# Altium footprint library ACTION_Connector.PcbLib: 123 footprints (part 1 of 8)
Each footprint in its own frame and in the unit in brackets; x right, y up, seen from the top. Pads: shape width x height; smd on the part's side, far side on the other; paste and mask are expansions set on the pad; w line width, h text height; cw(c..) or ccw(c..) is an arc to the next point about the centre after c.
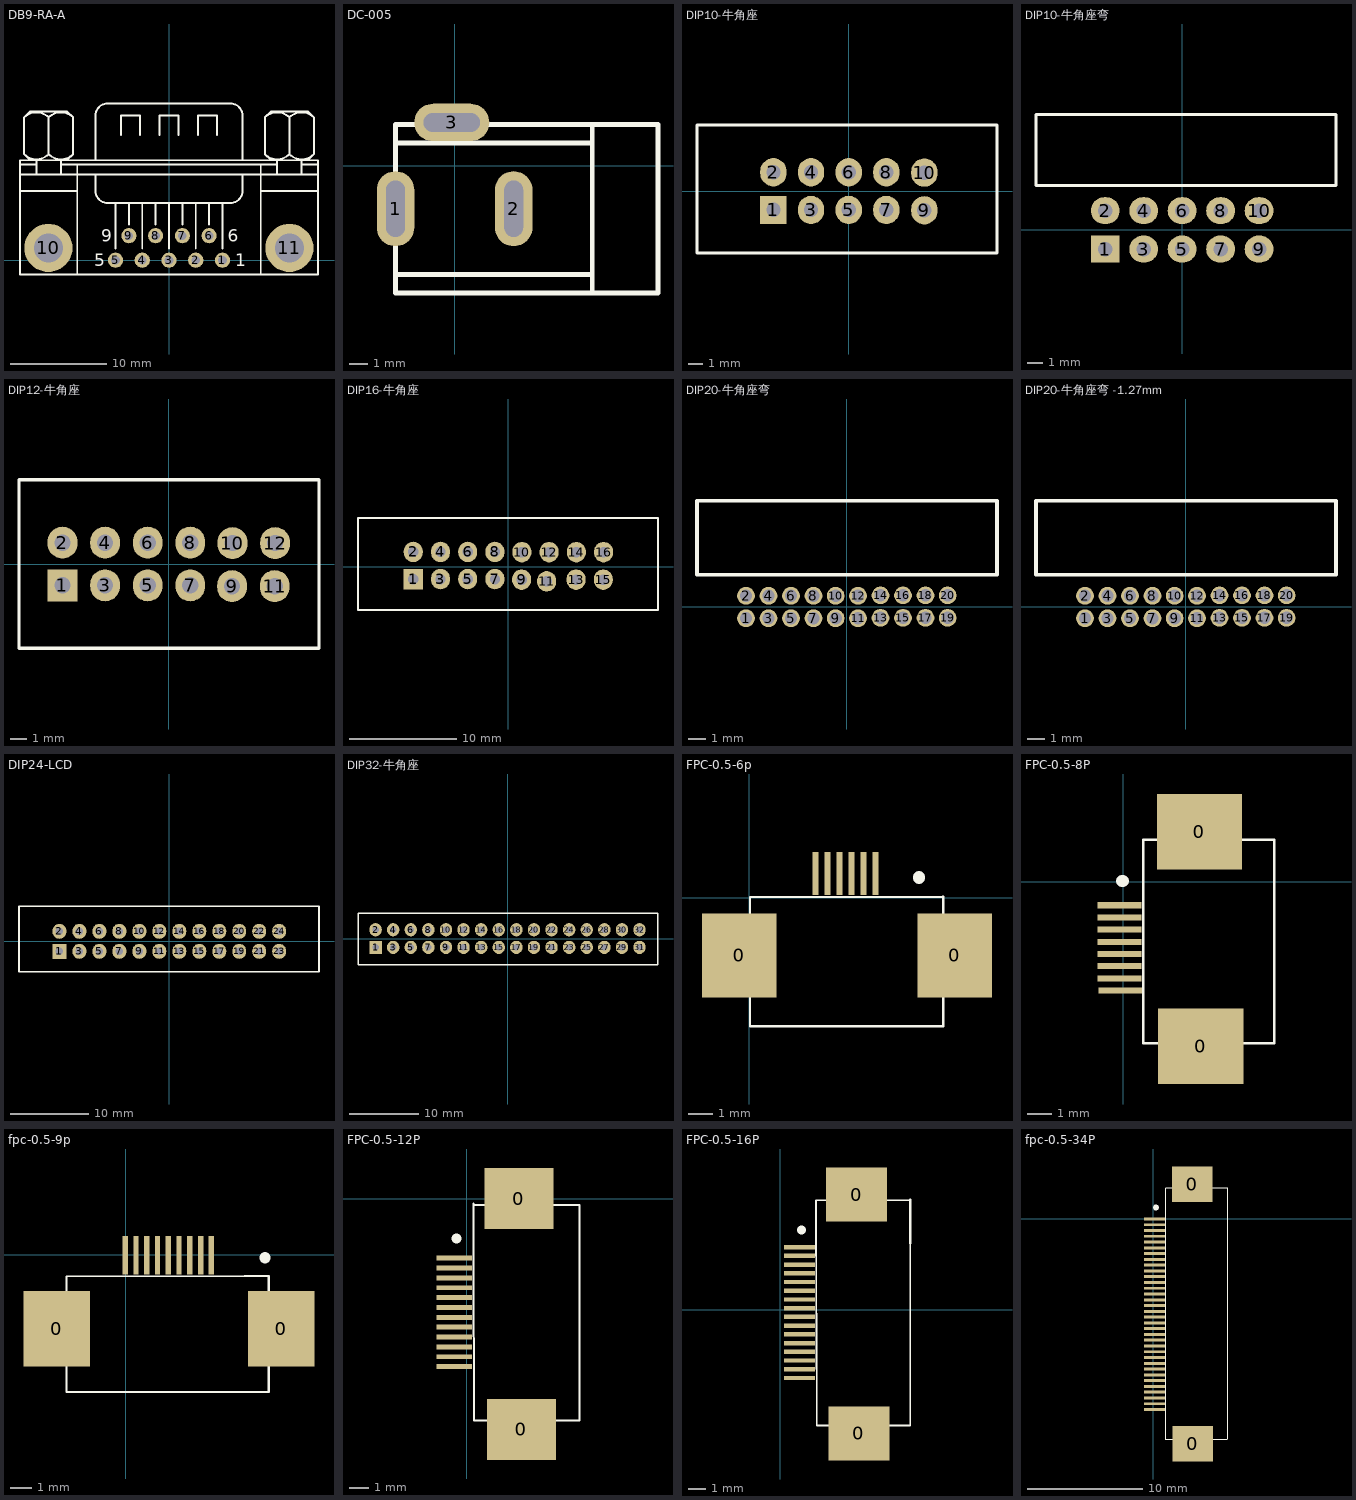
[diagram p0: the footprints below, top view; thin cyan lines are the x and y axes]

## DB9-RA-A [mil]
pads (11):
  round 62 hole 35: 1(218.33,0) 2(109.17,0) 3(0,0) 4(-109.17,0) 5(-218.33,0) 6(163.75,100) 7(54.58,100) 8(-54.58,100) 9(-163.75,100)
  round 196.67 hole 118.33: 10(-492.5,50) 11(491.67,50)
Top Overlay:
  lines w7.87: -608.79,283.07 -374.54,283.07 ; -608.79,349.74 608.79,349.74 ; -608.79,391.4 -541.67,391.4 ; -591.75,432.99 ccw(c-541.67,483.07) -491.58,432.99 ; -591.75,583.16 cw(c-541.67,533.07) -491.58,583.16 ; -566.67,408.07 -591.67,433.07 -591.67,583.07 -566.67,608.07 -416.67,608.07 -391.67,583.07 -391.67,433.07 -416.67,408.07 ; -541.67,349.74 -541.67,408.07 ; -491.75,432.99 ccw(c-441.67,483.07) -391.58,432.99 ; -491.75,583.16 cw(c-441.67,533.07) -391.58,583.16 ; -491.67,433.07 -491.67,583.07 ; -441.67,349.74 -441.67,408.07 ; -441.67,391.4 440.83,391.4 ; -374.54,-59.06 -374.54,391.4 ; -300,349.74 -300,283.07 ccw(c-250,283.07) -250,233.07 ; -300,408.07 -300,590.55 cw(c-250,590.55) -250,640.55 250,640.55 cw(c250,590.55) 300,590.55 300,408.07 ; -218.33,47.24 -218.33,233.07 ; -196.85,511.81 -196.85,590.55 -118.11,590.55 -118.11,511.81 ; -163.75,145.67 -163.75,233.07 ; -109.17,47.24 -109.17,233.07 ; -54.58,145.67 -54.58,233.07 ; -39.37,511.81 -39.37,590.55 0,590.55 39.37,590.55 39.37,511.81 ; 0,47.24 0,233.07 -250,233.07 ; 54.58,145.67 54.58,233.07 ; 109.17,47.24 109.17,233.07 ; 118.11,511.81 118.11,590.55 196.85,590.55 196.85,511.81 ; 163.75,145.67 163.75,233.07 ; 218.33,47.24 218.33,233.07 ; 300,349.74 300,283.07 cw(c250,283.07) 250,233.07 -250,233.07 ; 374.54,-59.06 374.54,391.4 ; 374.54,283.07 608.79,283.07 ; 391.58,432.99 ccw(c441.67,483.07) 491.75,432.99 ; 391.58,583.16 cw(c441.67,533.07) 491.75,583.16 ; 416.67,408.07 391.67,433.07 391.67,583.07 416.67,608.07 566.67,608.07 591.67,583.07 591.67,433.07 566.67,408.07 ; 440.83,349.74 440.83,408.07 ; 491.58,432.99 ccw(c541.66,483.07) 591.75,432.99 ; 491.58,583.16 cw(c541.66,533.07) 591.75,583.16 ; 491.67,433.07 491.67,583.07 ; 540.83,349.74 540.83,408.07 ; 540.83,391.4 608.79,391.4 ; -608.79,-59.06 -608.79,408.07 608.79,408.07 608.79,-59.06 366.67,-59.06 -366.67,-59.06 -608.79,-59.06
  text "9" at -275.75,74.8 h50
  text "5" at -304.46,-25.59 h50
  text "1" at 271.18,-25.59 h50
  text "6" at 239.68,74.8 h50
3D body "User Library-DRB-9M.STEP": height 501.97, standoff -143.7, extent -599.29,-58.8 601.5,638.05

## DC-005 [mm]
pads (3):
  oval 2x4 hole 1 slot 3 at 90 deg: 1(-3.15,-2.3) 2(3.15,-2.3)
  oval 4x2 hole 1 slot 3 at 0 deg: 3(-0.15,2.3)
Top Overlay:
  lines w0.254: -3.15,-5.805 7.34,-5.805 ; -3.15,1.205 7.34,1.205 ; 7.34,-6.796 7.34,2.196 ; -3.15,-6.796 10.845,-6.796 10.845,2.196 -3.15,2.196 -3.15,-6.796
3D body "User Library-dc range - dc connector[4840_2201].STEP": height 11.02, standoff -3.48, extent -3.193,-6.803 10.633,2.703

## DIP10-牛角座 [mil]
pads (10):
  rect 70x75 hole 38: 1(-200.5,-49.5)
  oval 70x75 hole 38: 2(-200.5,50.5) 3(-100.5,-49.5) 4(-100.5,50.5) 5(-0.5,-49.5) 6(-0.5,50.5) 7(99.5,-49.5) 8(99.5,50.5) 9(200.5,-50.5) 10(200.5,49.5)
Top Overlay:
  lines w7.87: -403.5,-163.5 393.5,-163.5 393.5,175.5 -403.5,175.5 -403.5,-163.5
3D body "BH-10.STEP": height 348.1, standoff -129.92, extent -406.29,-171.7 395.29,190.5

## DIP10-牛角座弯 [mil] "Connector; Header; 7x2 Position"
height 23.62
pads (10):
  rect 75x70 hole 38: 1(-200,-50)
  oval 75x70 hole 38: 2(-200,50) 3(-100,-50) 4(-100,50) 5(0,-50) 6(0,50) 7(100,-50) 8(100,50) 9(200,-50) 10(200,50)
Top Overlay:
  lines w7.87: -380,115 -380,300 400,300 400,115 -380,115

## DIP12-牛角座 [mil]
pads (12):
  rect 70x75 hole 38: 1(-249.5,-49)
  oval 70x75 hole 38: 2(-249.5,51) 3(-149.5,-49) 4(-149.5,51) 5(-49.5,-49) 6(-49.5,51) 7(50.5,-49) 8(50.5,51) 9(148.5,-51) 10(149.5,50) 11(248.5,-51) 12(249.5,50)
Top Overlay:
  lines w7.87: -351.5,-197 352.5,-197 352.5,199 -351.5,199 -351.5,-197
3D body "牛角座-12P-2.54直针.stp": height 128.74, standoff -414.57, extent -346.56,-187.92 345.57,195.94

## DIP16-牛角座 [mil]
pads (16):
  rect 70x75 hole 38: 1(-349.5,-46)
  oval 70x75 hole 38: 2(-349.5,54) 3(-249.5,-46) 4(-249.5,54) 5(-149.5,-46) 6(-149.5,54) 7(-49.5,-46) 8(-49.5,54) 9(48.5,-48) 10(49.5,53) 11(140.5,-54) 12(149.5,53) 13(248.5,-48) 14(249.5,53) 15(348.5,-48) 16(349.5,53)
Top Overlay:
  lines w7.87: -552.5,-160 549.5,-160 549.5,179 -552.5,179 -552.5,-160
3D body "BH-16.STEP": height 348.1, standoff -129.92, extent -548.29,-170.2 553.29,192

## DIP20-牛角座弯 [mm]
pads (20):
  round 1 hole 0.7: 1(-5.692,-0.648) 2(-5.692,0.622) 3(-4.422,-0.648) 4(-4.422,0.622) 5(-3.152,-0.648) 6(-3.152,0.622) 7(-1.882,-0.648) 8(-1.882,0.622) 9(-0.632,-0.648) 10(-0.632,0.622) 11(0.632,-0.648) 12(0.632,0.622) 13(1.902,-0.622) 14(1.902,0.648) 15(3.172,-0.622) 16(3.172,0.648) 17(4.442,-0.622) 18(4.442,0.648) 19(5.692,-0.622) 20(5.692,0.648)
Top Overlay:
  lines w0.198: -8.461,1.816 -8.461,5.982 8.481,5.982 8.481,1.816 -8.436,1.816

## DIP20-牛角座弯 -1.27mm [mm]
pads (20):
  round 1 hole 0.7: 1(-5.692,-0.648) 2(-5.692,0.622) 3(-4.422,-0.648) 4(-4.422,0.622) 5(-3.152,-0.648) 6(-3.152,0.622) 7(-1.882,-0.648) 8(-1.882,0.622) 9(-0.632,-0.648) 10(-0.632,0.622) 11(0.632,-0.648) 12(0.632,0.622) 13(1.902,-0.622) 14(1.902,0.648) 15(3.172,-0.622) 16(3.172,0.648) 17(4.442,-0.622) 18(4.442,0.648) 19(5.692,-0.622) 20(5.692,0.648)
Top Overlay:
  lines w0.198: -8.461,1.816 -8.461,5.982 8.481,5.982 8.481,1.816 -8.436,1.816

## DIP24-LCD [mil]
pads (24):
  rect 70x75 hole 38: 1(-550,-50)
  oval 70x75 hole 38: 2(-550,50) 3(-450,-50) 4(-450,50) 5(-350,-50) 6(-350,50) 7(-250,-50) 8(-250,50) 9(-150,-50) 10(-150,50) 11(-50,-50) 12(-50,50) 13(50,-50) 14(50,50) 15(150,-50) 16(150,50) 17(250,-50) 18(250,50) 19(350,-50) 20(350,50) 21(450,-50) 22(450,50) 23(550,-50) 24(550,50)
Top Overlay:
  lines w7.87: -752,-153 -752,176 749,176 749,-153 -752,-153

## DIP32-牛角座 [mil]
pads (32):
  rect 70x75 hole 38: 1(-750,-50)
  oval 70x75 hole 38: 2(-750,50) 3(-650,-50) 4(-650,50) 5(-550,-50) 6(-550,50) 7(-450,-50) 8(-450,50) 9(-350,-50) 10(-350,50) 11(-250,-50) 12(-250,50) 13(-150,-50) 14(-150,50) 15(-50,-50) 16(-50,50) 17(50,-50) 18(50,50) 19(150,-50) 20(150,50) 21(250,-50) 22(250,50) 23(350,-50) 24(350,50) 25(450,-50) 26(450,50) 27(550,-50) 28(550,50) 29(650,-50) 30(650,50) 31(750,-50) 32(750,50)
Top Overlay:
  lines w7.87: -850,-150 -850,145 855,145 855,-150 -850,-150

## FPC-0.5-6p [mm]
pads (8):
  rect 3.1x3.5 smd: 0(-0.432,-2.388) 0(8.56,-2.388)
  rect 0.25x1.8 smd: 1(2.755,1.016) 2(3.255,1.016) 3(3.755,1.016) 4(4.255,1.016) 5(4.755,1.016) 6(5.255,1.016)
Top Overlay:
  lines w0.1: 8.052,0.05 0.025,0.026 0.025,-5.334 8.077,-5.334 8.077,0.051
  lines w0.5: 7.061,0.838 7.061,0.864
3D body "FPC-6pin .stp": height 2.02, standoff -0.03, extent -0.2,-4.943 8.23,0.167

## FPC-0.5-8P [mm]
pads (10):
  rect 3.5x3.1 smd: 0(3.124,2.056) 0(3.175,-6.758)
  rect 1.8x0.25 smd: 1(-0.152,-0.967) 2(-0.152,-1.467) 3(-0.152,-1.967) 4(-0.152,-2.467) 5(-0.152,-2.967) 6(-0.152,-3.467) 7(-0.152,-3.967) 8(-0.127,-4.472)
Top Overlay:
  lines w0.1: 0.813,-6.631 0.813,-0.764 ; 0.813,-0.916 0.813,1.726 6.198,1.726 6.198,-6.631
  lines w0.101: 0.813,-6.631 6.198,-6.631
  lines w0.5: -0.051,0.024 -0.025,0.024
3D body "FPC-8-0.5MM.stp": height 2.02, standoff -0.03, extent 0.615,-7.407 5.725,2.023

## fpc-0.5-9p [mm]
pads (11):
  rect 3.1x3.5 smd: 0(-3.2,-3.429) 0(7.239,-3.429)
  rect 0.25x1.8 smd: 1(-0.014,-0.025) 2(0.486,-0.025) 3(0.986,-0.025) 4(1.486,-0.025) 5(1.986,-0.025) 6(2.486,-0.025) 7(2.986,-0.025) 8(3.486,-0.025) 9(3.986,-0.025)
Top Overlay:
  lines w0.1: 5.537,-0.991 6.629,-0.991 ; 5.69,-0.991 -2.743,-1.015 -2.743,-6.375 6.629,-6.375 ; 6.655,-6.375 6.655,-0.991
  lines w0.5: 6.477,-0.152 6.477,-0.127
3D body "FPC-9-0.5MM.stp": height 2.02, standoff -0.03, extent -2.984,-5.897 6.946,-0.787

## FPC-0.5-12P [mm]
pads (14):
  rect 3.5x3.1 smd: 0(2.642,0) 0(2.769,-11.709)
  rect 1.8x0.25 smd: 1(-0.635,-3.023) 2(-0.635,-3.523) 3(-0.635,-4.023) 4(-0.635,-4.523) 5(-0.635,-5.023) 6(-0.635,-5.523) 7(-0.635,-6.023) 8(-0.635,-6.523) 9(-0.635,-7.023) 10(-0.635,-7.523) 11(-0.635,-8.023) 12(-0.635,-8.523)
Top Overlay:
  lines w0.1: 0.33,-2.972 0.33,-0.254 ; 0.33,-2.819 0.355,-11.252 5.715,-11.252 5.715,-0.33 0.33,-0.33
  lines w0.5: -0.533,-2.032 -0.508,-2.032
3D body "1-1734839-2.stp": height 2.02, standoff -0.03, extent 0.082,-11.455 5.192,-0.025

## FPC-0.5-16P [mm]
pads (18):
  rect 3.5x3.1 smd: 0(4.369,6.599) 0(4.496,-7.112)
  rect 1.8x0.25 smd: 1(1.092,3.576) 2(1.092,3.076) 3(1.092,2.576) 4(1.092,2.076) 5(1.092,1.576) 6(1.092,1.076) 7(1.092,0.576) 8(1.092,0.076) 9(1.092,-0.424) 10(1.092,-0.925) 11(1.092,-1.425) 12(1.092,-1.925) 13(1.092,-2.425) 14(1.092,-2.925) 15(1.092,-3.425) 16(1.092,-3.925)
Top Overlay:
  lines w0.1: 2.044,6.274 2.082,-6.655 7.442,-6.655 7.442,4.267 ; 2.057,6.269 7.442,6.269
  lines w0.127: 7.442,3.8 7.442,6.294
  lines w0.5: 1.194,4.567 1.219,4.567
3D body "FPC-12pin.stp": height 2.07, standoff -0.03, extent 1.676,-7.428 6.776,7.072

## fpc-0.5-34P [mm]
pads (36):
  rect 3.5x3.1 smd: 0(3.378,2.997) 0(3.404,-19.533)
  rect 1.8x0.25 smd: 1(0.102,-0.025) 2(0.102,-0.525) 3(0.102,-1.025) 4(0.102,-1.525) 5(0.102,-2.025) 6(0.102,-2.525) 7(0.102,-3.025) 8(0.102,-3.525) 9(0.102,-4.025) 10(0.102,-4.525) 11(0.102,-5.025) 12(0.102,-5.525) 13(0.102,-6.039) 14(0.102,-6.539) 15(0.102,-7.039) 16(0.102,-7.539) 17(0.102,-8.039) 18(0.102,-8.539) 19(0.102,-9.039) 20(0.102,-9.539) 21(0.102,-10.039) 22(0.102,-10.539) 23(0.102,-11.039) 24(0.102,-11.539) 25(0.101,-12.051) 26(0.101,-12.551) 27(0.101,-13.051) 28(0.101,-13.551) 29(0.101,-14.051) 30(0.101,-14.551) 31(0.101,-15.051) 32(0.101,-15.551) 33(0.101,-16.051) 34(0.101,-16.551)
Top Overlay:
  lines w0.1: 1.041,-19.152 6.426,-19.152 ; 1.067,-19.075 1.067,0.178 ; 1.067,0.025 1.067,2.642 ; 1.067,2.667 6.452,2.667 6.452,-19.101
  lines w0.5: 0.203,0.965 0.229,0.965
3D body "FPC34-0.5MM.stp": height 1.97, standoff -0.08, extent 0.508,-19.495 5.618,2.935